# Altium footprint library SG__PCB_HOLE_Connector.PcbLib: 174 footprints (part 1 of 11)
Each footprint in its own frame and in the unit in brackets; x right, y up, seen from the top. Pads: shape width x height; smd on the part's side, far side on the other; paste and mask are expansions set on the pad; w line width, h text height; cw(c..) or ccw(c..) is an arc to the next point about the centre after c.
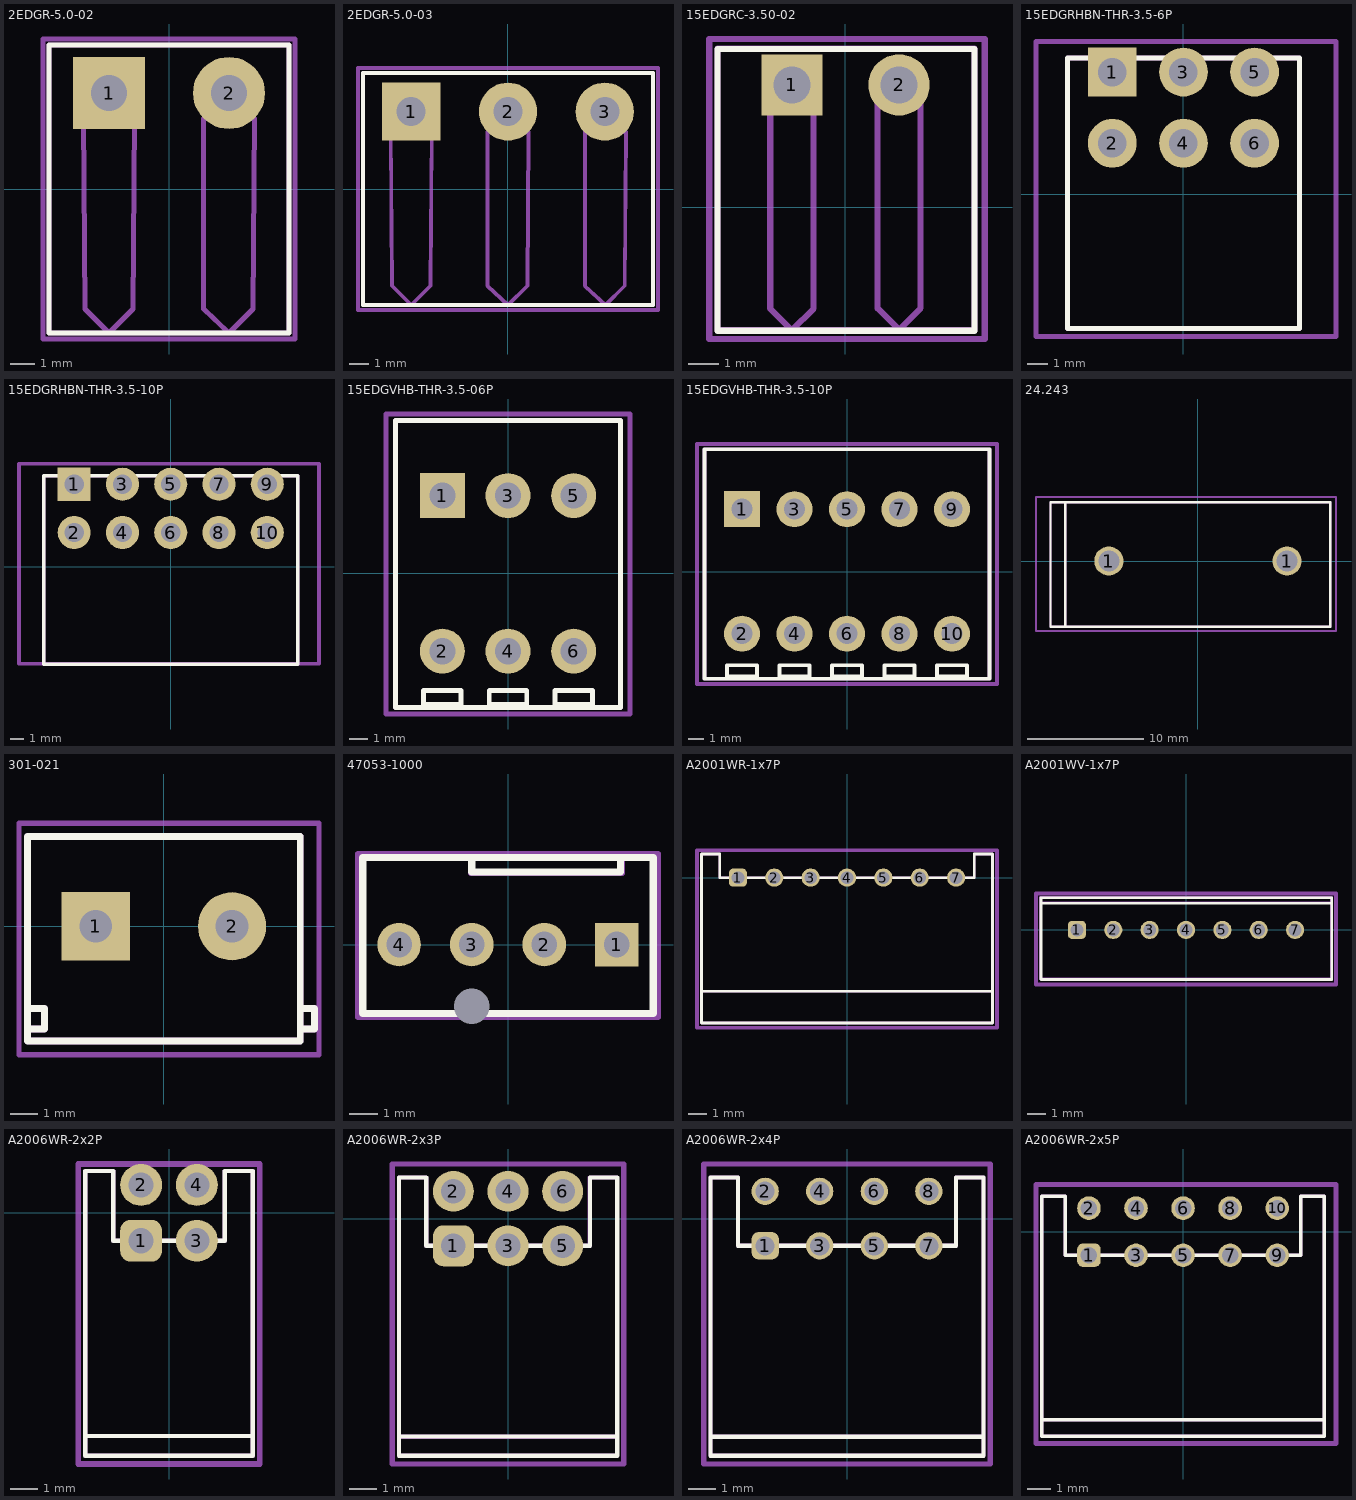
[diagram p0: the footprints below, top view; thin cyan lines are the x and y axes]

## 2EDGR-5.0-02 [mm]
pads (2):
  rect 3x3 hole 1.5: 1(-2.5,4)
  round 3 hole 1.5: 2(2.5,4)
Top Overlay:
  lines w0.2: -5,-6 5,-6 5,6 -5,6 -5,-6
Top Assembly:
  lines w0.2: -1.5,2.939 -3.561,2.939 -3.5,-5 -2.5,-6 -1.5,-5 -1.439,2.939 ; 3.301,2.939 3.5,2.939 1.439,2.939 1.439,-5 2.5,-6 3.5,-5 3.561,2.939 ; -5,-6 -5,6 5,6 5,-6 -5,-6
Top Courtyard:
  lines w0.2: -5.25,-6.25 5.25,-6.25 5.25,6.25 -5.25,6.25 -5.25,-6.25
3D body "2EDGR-5.0-02P-1Y-100AH.stp": height 8.9, standoff -2.8, extent -5,-6 5,6

## 2EDGR-5.0-03 [mm]
pads (3):
  rect 3x3 hole 1.5: 1(-5,4)
  round 3 hole 1.5: 2(0,4) 3(5,4)
Top Overlay:
  lines w0.2: -7.5,-6 7.5,-6 7.5,6 -7.5,6 -7.5,-6
Top Assembly:
  lines w0.2: -4,2.939 -6.061,2.939 -6,-5 -5,-6 -4,-5 -3.939,2.939 ; 0.801,2.939 1,2.939 -1.061,2.939 -1.061,-5 0,-6 1,-5 1.061,2.939 ; 5.831,2.939 6.03,2.939 3.97,2.939 3.97,-5 5.03,-6 6.03,-5 6.091,2.939 ; -7.5,-6 -7.5,6 7.5,6 7.5,-6 -7.5,-6
Top Courtyard:
  lines w0.2: -7.75,-6.25 7.75,-6.25 7.75,6.25 -7.75,6.25 -7.75,-6.25
3D body "2EDGR-5.0-03P-1Y-100AH.stp": height 8.9, standoff -2.8, extent -7.5,-6 7.5,6

## 15EDGRC-3.50-02 [mm]
pads (2):
  rect 2x2 hole 1.2: 1(-1.75,4)
  round 2 hole 1.2: 2(1.75,4)
Top Overlay:
  lines w0.2: -4.179,-4.031 4.221,-4.031 4.221,5.169 -4.179,5.169 -4.179,-4.031
Top Assembly:
  lines w0.2: -4.186,-4.015 -4.186,5.185 4.213,5.185 4.213,-4.015 -4.186,-4.015 ; -2.457,-3.307 -1.75,-4.015 -1.043,-3.307 -1.043,3.5 -2.457,3.5 -2.457,-3.307 ; 1.05,-3.3 1.75,-4 2.457,-3.293 2.457,3.5 1.05,3.5 1.05,-3.3
Top Courtyard:
  lines w0.2: -4.45,-4.3 -4.45,5.5 4.55,5.5 4.55,-4.3 -4.45,-4.3
3D body "15EDGRC-THR-3.5-02P-13-10A(H).stp": height 7, standoff -3.6, extent -4.186,-4.015 4.213,5.185

## 15EDGRHBN-THR-3.5-6P [mm]
pads (6):
  rect 2.4x2.4 hole 1.4: 1(-3.5,6)
  round 2.4 hole 1.4: 2(-3.5,2.5) 3(0,6) 4(0,2.5) 5(3.5,6) 6(3.5,2.5)
Top Overlay:
  lines w0.254: -5.7,-6.601 5.7,-6.601 5.7,6.699 -5.7,6.699 -5.7,-6.601
Top Assembly:
  lines w0.254: -5.7,-6.601 5.7,-6.601 5.7,6.699 -5.7,6.699 -5.7,-6.601
Top Courtyard:
  lines w0.254: -7.25,-7 7.5,-7 7.5,7.5 -7.25,7.5 -7.25,-7
3D body "15EDGRHBN-THR-3.5-06P-13-10A&Z(H).stp": height 15.4, standoff -2.5, extent -7.024,-6.71 7.176,6.59

## 15EDGRHBN-THR-3.5-10P [mm]
pads (10):
  rect 2.4x2.4 hole 1.4: 1(-7,6)
  round 2.4 hole 1.4: 2(-7,2.5) 3(-3.5,6) 4(-3.5,2.5) 5(0,6) 6(0,2.5) 7(3.5,6) 8(3.5,2.5) 9(7,6) 10(7,2.5)
Top Overlay:
  lines w0.254: -9.2,-7.066 9.2,-7.066 9.2,6.598 -9.2,6.598 -9.2,-7.066
Top Assembly:
  lines w0.254: -9.2,-7.066 9.2,-7.066 9.2,6.598 -9.2,6.598 -9.2,-7.066
Top Courtyard:
  lines w0.254: -11,-7 10.75,-7 10.75,7.5 -11,7.5 -11,-7
3D body "15EDGRHBN-THR-3.5-10P-13-10A&Z(H).stp": height 15.3, standoff -2.6, extent -10.655,-6.754 10.545,6.546

## 15EDGVHB-THR-3.5-06P [mm]
pads (6):
  rect 2.4x2.4 hole 1.4: 1(-3.5,4.15)
  round 2.4 hole 1.4: 2(-3.5,-4.15) 3(0,4.15) 4(0,-4.15) 5(3.5,4.15) 6(3.5,-4.15)
Top Overlay:
  lines w0.254: -6,-7.15 6,-7.15 6,8.15 -6,8.15 -6,-7.15 ; -4.5,-7 -2.5,-7 -2.5,-6.25 -4.5,-6.25 -4.5,-7 ; -1,-7 1,-7 1,-6.25 -1,-6.25 -1,-7 ; 2.5,-7 4.5,-7 4.5,-6.25 2.5,-6.25 2.5,-7
Top Assembly:
  lines w0.254: -6,-7.15 6,-7.15 6,8.15 -6,8.15 -6,-7.15
Top Courtyard:
  lines w0.254: -6.5,-7.5 6.5,-7.5 6.5,8.5 -6.5,8.5 -6.5,-7.5
3D body: height 13.3, standoff 0, extent -6,-7 6,8

## 15EDGVHB-THR-3.5-10P [mm]
pads (10):
  rect 2.4x2.4 hole 1.4: 1(-7,4.15)
  round 2.4 hole 1.4: 2(-7,-4.15) 3(-3.5,4.15) 4(-3.5,-4.15) 5(0,4.15) 6(0,-4.15) 7(3.5,4.15) 8(3.5,-4.15) 9(7,4.15) 10(7,-4.15)
Top Overlay:
  lines w0.254: -9.5,-7.15 9.5,-7.15 9.5,8.15 -9.5,8.15 -9.5,-7.15 ; -8,-7 -6,-7 -6,-6.25 -8,-6.25 -8,-7 ; -4.5,-7 -2.5,-7 -2.5,-6.25 -4.5,-6.25 -4.5,-7 ; -1,-7 1,-7 1,-6.25 -1,-6.25 -1,-7 ; 2.5,-7 4.5,-7 4.5,-6.25 2.5,-6.25 2.5,-7 ; 6,-7 8,-7 8,-6.25 6,-6.25 6,-7
Top Assembly:
  lines w0.254: -9.5,-7.15 9.5,-7.15 9.5,8.15 -9.5,8.15 -9.5,-7.15
Top Courtyard:
  lines w0.254: -10,-7.5 10,-7.5 10,8.5 -10,8.5 -10,-7.5
3D body "15EDGVHB-THR-3.5-10P-1Y-10A&Z(H).stp": height 13.5, standoff -2.4, extent -9.429,-7.103 9.571,8.197

## 24.243 [mm] "Banan_Deltron_571-0100"
pads (2):
  round 2.5 hole 1.8: 1(-7.65,0) 1(7.65,0)
Top Overlay:
  lines w0.2: -11.487,5.05 -11.402,5.05 -11.402,-5.65 ; -12.65,-5.65 -12.65,5.05 11.35,5.05 11.35,-5.65 -12.65,-5.65
Top Assembly:
  lines w0.2: -11.487,5.05 -11.402,5.05 -11.402,-5.65 ; -12.65,-5.65 11.35,-5.65 11.35,5.05 -12.65,5.05 -12.65,-5.65
Top Courtyard:
  lines w0.2: -13.9,-6 -13.9,5.5 11.85,5.5 11.85,-6 -13.9,-6
3D body "Banana_black.step": height 13.5, standoff -5.5, extent -12.65,-5.65 11.35,5.05

## 301-021 [mm] "301-021 Клеммник"
pads (2):
  rect 2.5x2.5 hole 1.2: 1(-2.5,0)
  round 2.5 hole 1.2: 2(2.5,0)
Top Overlay:
  lines w0.254: -4.892,-3.772 -4.384,-3.772 -4.384,-3.01 -4.892,-3.01 ; 5.014,-3.772 5.522,-3.772 5.522,-3.01 5.014,-3.01 ; -5,-4.2 -5,3.3 5,3.3 5,-4.2 -5,-4.2
Top Assembly:
  lines w0.254: -4.892,-3.772 -4.384,-3.772 -4.384,-3.01 -4.892,-3.01 ; 5.014,-3.772 5.522,-3.772 5.522,-3.01 5.014,-3.01 ; -5,-4.2 5,-4.2 5,3.3 -5,3.3 -5,-4.2
Top Courtyard:
  lines w0.2: -5.312,-4.716 5.688,-4.716 5.688,3.784 -5.312,3.784 -5.312,-4.716
3D body "301-021.stp": height 10, standoff -3.46, extent -4.9,-4.1 5.6,3.5

## 47053-1000 [mil] "PC Fan Header"
pads (5):
  round 0 hole 49.21 unplated: 0(-50,-85.04)
  rect 60x60 hole 35.43: 1(150,0)
  round 60 hole 35.43: 2(50,0) 3(-50,0) 4(-150,0)
Top Overlay:
  lines w10: -50,120 -50,100 155,100 155,115 ; -200,-95 -200,120 200,120 200,-95 -200,-95
Top Assembly:
  lines w7.87: -200.79,-98.43 204.72,-98.43 204.72,122.05 -200.79,122.05 -200.79,-98.43 ; -51.18,98.43 157.48,98.43 157.48,122.05 -51.18,122.05 -51.18,98.43
Top Courtyard:
  lines w7.87: -206.69,-100 206.69,-100 206.69,125 -206.69,125 -206.69,-100
3D body "470531000.stp": height 397.64, standoff -133.86, extent -200.79,-100 200.79,129.92

## A2001WR-1x7P [mm] "PLD-7-2.0"
pads (7):
  rrect50% 1x1 / inner rrect50% 1.5x1.5 / far side rrect50% 1.6x1.6 hole 0.7: 1(-6,0)
  round 1 / inner round 1.5 / far side round 1.6 hole 0.7: 2(-4,0) 3(-2,0) 4(0,0) 5(2,0) 6(4,0) 7(6,0)
Top Overlay:
  lines w0.152: -8,-6.25 8,-6.25 ; -8,-8 -5.1,-8 8,-8 8,1.3 7,1.3 7,0 -1,0 -7,0 -7,1.3 -8,1.3 -8,0 -8,-8
Top Assembly:
  lines w0.152: -8,-6.25 8,-6.25 ; -8,-8 -8,0 -8,1.3 -7,1.3 -7,0 -1,0 7,0 7,1.3 8,1.3 8,-8 -5.1,-8 -8,-8
Top Courtyard:
  lines w0.2: -8.25,-8.25 8.25,-8.25 8.25,1.5 -8.25,1.5 -8.25,-8.25
3D body: height 4.85, standoff 0, extent -8,-8 8,1.3

## A2001WV-1x7P [mm] "PLD-7-2.0"
pads (7):
  rrect50% 1x1 / inner rrect50% 1.5x1.5 / far side rrect50% 1.6x1.6 hole 0.7: 1(-6,0)
  round 1 / inner round 1.5 / far side round 1.6 hole 0.7: 2(-4,0) 3(-2,0) 4(0,0) 5(2,0) 6(4,0) 7(6,0)
Top Overlay:
  lines w0.152: -7.982,1.468 8.018,1.468 ; -7.982,-2.732 -7.982,1.768 8.018,1.768 8.018,-2.732 -7.982,-2.732
Top Assembly:
  lines w0.152: -8,1.5 8,1.5 ; -8,-2.7 8,-2.7 8,1.8 -8,1.8 -8,-2.7
Top Courtyard:
  lines w0.2: -8.25,-3 -8.25,2 8.25,2 8.25,-3 -8.25,-3
3D body: height 6.1, standoff 0, extent -8,-2.7 8,1.8

## A2006WR-2x2P [mm] "PLD-10-2.0"
pads (4):
  rrect50% 1.5x1.5 hole 0.9: 1(-1,-1)
  round 1.5 hole 0.9: 2(-1,1) 3(1,-1) 4(1,1)
Top Overlay:
  lines w0.152: -3,-8 3,-8 ; -3,-8.7 3,-8.7 3,-3 3,1.5 2,1.5 2,-1 -2,-1 -2,1.5 -3,1.5 -3,-1 -3,-8.7
Top Assembly:
  lines w0.152: -3,-8 3,-8 ; -3,-8.7 3,-8.7 3,-3 3,1.5 2,1.5 2,-1 -2,-1 -2,1.5 -3,1.5 -3,-1 -3,-8.7
Top Courtyard:
  lines w0.2: -3.25,-9 -3.25,1.75 3.25,1.75 3.25,-9 -3.25,-9
3D body: height 5, standoff 0, extent -3,-8.7 3,1.5

## A2006WR-2x3P [mm] "PLD-10-2.0"
pads (6):
  rrect50% 1.5x1.5 hole 0.9: 1(-2,-1)
  round 1.5 hole 0.9: 2(-2,1) 3(0,-1) 4(0,1) 5(2,-1) 6(2,1)
Top Overlay:
  lines w0.152: -3.996,-7.996 4.004,-7.996 ; -3.996,-8.696 4.004,-8.696 4.004,-0.996 4.004,1.504 3.004,1.504 3.004,-0.996 -2.996,-0.996 -2.996,1.504 -3.996,1.504 -3.996,-0.996 -3.996,-8.696
Top Assembly:
  lines w0.152: -4,-8 4,-8 ; -4,-8.7 -4,-1 -4,1.5 -3,1.5 -3,-1 3,-1 3,1.5 4,1.5 4,-1 4,-8.7 -4,-8.7
Top Courtyard:
  lines w0.2: -4.25,-9 -4.25,2 4.25,2 4.25,-9 -4.25,-9
3D body: height 5, standoff 0, extent -4,-8.7 4,1.5

## A2006WR-2x4P [mm] "PLD-10-2.0"
pads (8):
  rrect50% 1x1 / inner rrect50% 1.5x1.5 / far side rrect50% 1.6x1.6 hole 0.7: 1(-3,-1)
  round 1 / inner round 1.5 / far side round 1.6 hole 0.7: 2(-3,1) 3(-1,-1) 4(-1,1) 5(1,-1) 6(1,1) 7(3,-1) 8(3,1)
Top Overlay:
  lines w0.152: -5,-8 5,-8 ; -5,-8.7 5,-8.7 5,-3 5,1.5 4,1.5 4,-1 2,-1 -4,-1 -4,1.5 -5,1.5 -5,-1 -5,-8.7
Top Assembly:
  lines w0.152: -5,-8 5,-8 ; -5,-8.7 -5,-1 -5,1.5 -4,1.5 -4,-1 2,-1 4,-1 4,1.5 5,1.5 5,-3 5,-8.7 -5,-8.7
Top Courtyard:
  lines w0.2: -5.25,-9 -5.25,2 5.25,2 5.25,-9 -5.25,-9
3D body: height 5, standoff 0, extent -5,-8.7 5,1.5

## A2006WR-2x5P [mm] "PLD-10-2.0"
pads (10):
  rrect50% 1x1 / inner rrect50% 1.5x1.5 / far side rrect50% 1.6x1.6 hole 0.7: 1(-4,-1)
  round 1 / inner round 1.5 / far side round 1.6 hole 0.7: 2(-4,1) 3(-2,-1) 4(-2,1) 5(0,-1) 6(0,1) 7(2,-1) 8(2,1) 9(4,-1) 10(4,1)
Top Overlay:
  lines w0.152: -6,-8 -6,-8.7 4.5,-8.7 6,-8.7 6,-8 ; -6,-8 -6,-1 -6,1.5 -5,1.5 -5,-1 0.8,-1 5,-1 5,1.5 6,1.5 6,-3 6,-8 ; -6,-8 -4,-8 6,-8
Top Assembly:
  lines w0.152: -6,-8 -6,-1 -6,1.5 -5,1.5 -5,-1 0.8,-1 5,-1 5,1.5 6,1.5 6,-3 6,-8 ; -6,-8 -4,-8 6,-8 ; -6,-8 -6,-8.7 4.5,-8.7 6,-8.7 6,-8
Top Courtyard:
  lines w0.2: -6.25,-9 -6.25,2 6.5,2 6.5,-9 -6.25,-9
3D body "A2211WR-2X05P.STEP": height 5, standoff -2, extent -6,-8 6,1.5